# Altium footprint library Dart_Controller_Pcblib.PcbLib: 132 footprints (part 2 of 9)
Each footprint in its own frame and in the unit in brackets; x right, y up, seen from the top. Pads: shape width x height; smd on the part's side, far side on the other; paste and mask are expansions set on the pad; w line width, h text height; cw(c..) or ccw(c..) is an arc to the next point about the centre after c.
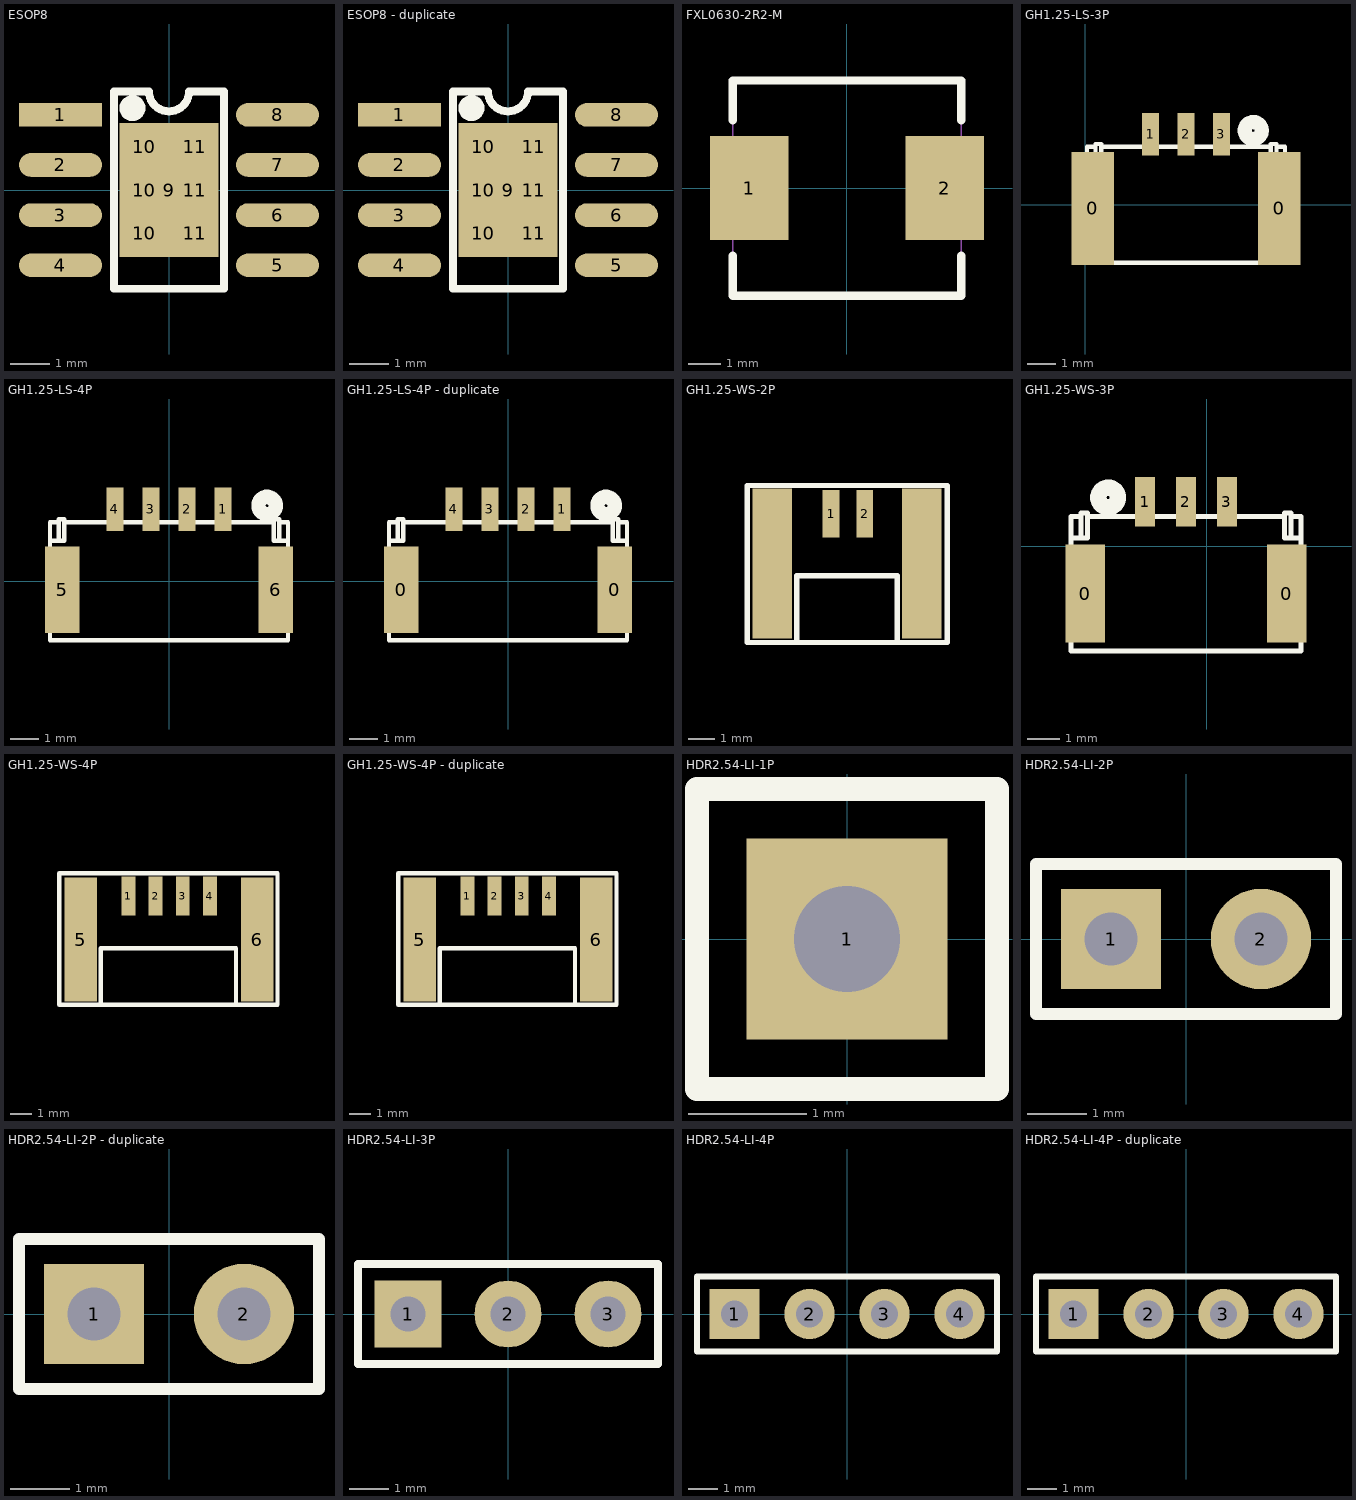
[diagram p1: the footprints below, top view; thin cyan lines are the x and y axes]

## ESOP8 [mm]
pads (15):
  rect 2.1x0.6 smd: 1(-2.75,1.905)
  oval 2.1x0.6 smd: 2(-2.75,0.635) 3(-2.75,-0.635) 4(-2.75,-1.905) 5(2.75,-1.905) 6(2.75,-0.635) 7(2.75,0.635) 8(2.75,1.905)
  rect 2.5x3.4 smd paste-2: 9(0,0)
  rect 0.9x0.7 on Top Paste: 10(-0.625,-1.1) 10(-0.625,0) 10(-0.625,1.1) 11(0.65,-1.1) 11(0.65,0) 11(0.65,1.1)
Top Overlay:
  circle w0.35: c-0.925,2.075 r0.155
  lines w0.2: -1.397,2.5 -1.397,-2.5 1.397,-2.5 1.397,2.5
  lines w0.203: -1.397,2.5 -0.508,2.5 ccw(c0,2.5) 0,1.992 ccw(c0,2.5) 0.508,2.5 1.397,2.5
Mechanical 15:
  circle w0.05: c0,0 r0.35
  lines w0.05: -0.5,0 0.5,0 ; 0,-0.5 0,0.5
3D body "ESOP8.STEP": height 1.53, standoff -0.01, extent -3.053,-2.5 2.953,2.5

## ESOP8 - duplicate [mm]
pads (15):
  rect 2.1x0.6 smd: 1(-2.75,1.905)
  oval 2.1x0.6 smd: 2(-2.75,0.635) 3(-2.75,-0.635) 4(-2.75,-1.905) 5(2.75,-1.905) 6(2.75,-0.635) 7(2.75,0.635) 8(2.75,1.905)
  rect 2.5x3.4 smd paste-2: 9(0,0)
  rect 0.9x0.7 on Top Paste: 10(-0.625,-1.1) 10(-0.625,0) 10(-0.625,1.1) 11(0.65,-1.1) 11(0.65,0) 11(0.65,1.1)
Top Overlay:
  circle w0.35: c-0.925,2.075 r0.155
  lines w0.2: -1.397,2.5 -1.397,-2.5 1.397,-2.5 1.397,2.5
  lines w0.203: -1.397,2.5 -0.508,2.5 ccw(c0,2.5) 0,1.992 ccw(c0,2.5) 0.508,2.5 1.397,2.5
Mechanical 15:
  circle w0.05: c0,0 r0.35
  lines w0.05: -0.5,0 0.5,0 ; 0,-0.5 0,0.5
3D body "ESOP8.STEP": height 1.53, standoff -0.01, extent -3.053,-2.5 2.953,2.5

## FXL0630-2R2-M [mm] "功率电感 2.2uh"
pads (2):
  rect 2.4x3.2 smd: 1(-3,0) 2(3,0)
Top Overlay:
  lines w0.254: -3.5,-2.081 -3.5,-3.3 -3.49,-3.3 3.5,-3.3 3.5,-2.081 ; -3.5,2.081 -3.5,3.3 3.48,3.3 3.5,3.28 ; 3.5,2.081 3.5,3.3
Mechanical 15:
  region: -3.44,-3.3 -3.44,-3.275 -3.475,-3.24 -3.525,-3.24 -3.56,-3.275 -3.56,-3.3 -3.56,-3.325 -3.525,-3.36 -3.475,-3.36 -3.44,-3.325
  region: 1.9,1.5 3.5,1.5 3.5,-1.5 1.9,-1.5
  region: -1.9,-1.5 -3.5,-1.5 -3.5,1.5 -1.9,1.5
  lines w0.051: -3.5,-3.3 -3.5,3.3 3.5,3.3 3.5,-3.3 -3.5,-3.3
3D body "2.uh-PCBModelSOLID.step": height 3.1, standoff 0, extent -3.691,-3.173 3.31,3.427

## GH1.25-LS-3P [mm] "A1257WR-S-3P"
height 1.5
pads (5):
  rect 1.5x4 smd: 0(0.254,-0.127) 0(6.858,-0.127)
  rect 0.6x1.5 smd: 1(2.306,2.5) 2(3.556,2.5) 3(4.806,2.5)
Top Overlay:
  circle w0.5: c5.932,2.627 r0.3
  lines w0.102: 2.206,2.15 2.206,2.85 2.406,2.85 2.406,2.15 ; 3.456,2.15 3.456,2.85 3.656,2.85 3.656,2.15 ; 4.706,2.15 4.706,2.85 4.906,2.85 4.906,2.15
  lines w0.152: 0.356,1.4 0.356,2.15 0.556,2.15 0.556,2.05 ; 0.356,2.05 0.056,2.05 0.056,1.4 ; 2.206,2.05 2.206,2.15 2.406,2.15 2.406,2.05 ; 3.456,2.05 3.456,2.15 3.656,2.15 3.656,2.05 ; 4.706,2.05 4.706,2.15 4.906,2.15 4.906,2.05 ; 6.756,1.4 6.756,2.15 6.556,2.15 6.556,2.05 ; 6.756,2.05 7.056,2.05 7.056,1.4 ; 0.056,1.4 0.556,1.4 0.556,2.05 ; 0.056,1.4 0.056,-2.05 7.056,-2.05 7.056,1.4 ; 0.556,2.05 6.556,2.05 ; 6.556,2.05 6.556,1.4 7.056,1.4
3D body "A1257WR-S-3P.stp": height 4.2, standoff -0.7, extent 0.691,-2.15 7.691,2.25

## GH1.25-LS-4P [mm] "A1257WR-S-4P"
height 1.5
pads (6):
  rect 0.6x1.5 smd: 1(1.875,2.5) 2(0.625,2.5) 3(-0.625,2.5) 4(-1.875,2.5)
  rect 1.2x3 smd: 5(-3.7,-0.3) 6(3.7,-0.3)
Top Overlay:
  circle w0.5: c3.401,2.627 r0.3
  lines w0.102: -1.975,2.15 -1.975,2.85 -1.775,2.85 -1.775,2.15 ; -0.725,2.15 -0.725,2.85 -0.525,2.85 -0.525,2.15 ; 0.525,2.15 0.525,2.85 0.725,2.85 0.725,2.15 ; 1.775,2.15 1.775,2.85 1.975,2.85 1.975,2.15
  lines w0.152: -3.825,1.4 -3.825,2.15 -3.625,2.15 -3.625,2.05 ; -3.825,2.05 -4.125,2.05 -4.125,1.4 ; -1.975,2.05 -1.975,2.15 -1.775,2.15 -1.775,2.05 ; -0.725,2.05 -0.725,2.15 -0.525,2.15 -0.525,2.05 ; 0.525,2.05 0.525,2.15 0.725,2.15 0.725,2.05 ; 1.775,2.05 1.775,2.15 1.975,2.15 1.975,2.05 ; 3.825,1.4 3.825,2.15 3.625,2.15 3.625,2.05 ; 3.825,2.05 4.125,2.05 4.125,1.4 ; -4.125,1.4 -4.125,-2.05 4.125,-2.05 4.125,1.4 ; -4.125,1.4 -3.625,1.4 -3.625,2.05 ; -3.625,2.05 3.625,2.05 ; 3.625,2.05 3.625,1.4 4.125,1.4
3D body "A1257WR-S-4P.stp": height 4.2, standoff -0.7, extent -4.125,-2.15 4.125,2.25

## GH1.25-LS-4P - duplicate [mm] "A1257WR-S-4P"
height 1.5
pads (6):
  rect 1.2x3 smd: 0(-3.7,-0.3) 0(3.7,-0.3)
  rect 0.6x1.5 smd: 1(1.875,2.5) 2(0.625,2.5) 3(-0.625,2.5) 4(-1.875,2.5)
Top Overlay:
  circle w0.5: c3.401,2.627 r0.3
  lines w0.102: -1.975,2.15 -1.975,2.85 -1.775,2.85 -1.775,2.15 ; -0.725,2.15 -0.725,2.85 -0.525,2.85 -0.525,2.15 ; 0.525,2.15 0.525,2.85 0.725,2.85 0.725,2.15 ; 1.775,2.15 1.775,2.85 1.975,2.85 1.975,2.15
  lines w0.152: -3.825,1.4 -3.825,2.15 -3.625,2.15 -3.625,2.05 ; -3.825,2.05 -4.125,2.05 -4.125,1.4 ; -1.975,2.05 -1.975,2.15 -1.775,2.15 -1.775,2.05 ; -0.725,2.05 -0.725,2.15 -0.525,2.15 -0.525,2.05 ; 0.525,2.05 0.525,2.15 0.725,2.15 0.725,2.05 ; 1.775,2.05 1.775,2.15 1.975,2.15 1.975,2.05 ; 3.825,1.4 3.825,2.15 3.625,2.15 3.625,2.05 ; 3.825,2.05 4.125,2.05 4.125,1.4 ; -4.125,1.4 -4.125,-2.05 4.125,-2.05 4.125,1.4 ; -4.125,1.4 -3.625,1.4 -3.625,2.05 ; -3.625,2.05 3.625,2.05 ; 3.625,2.05 3.625,1.4 4.125,1.4
3D body "A1257WR-S-4P.stp": height 4.2, standoff -0.7, extent -4.125,-2.15 4.125,2.25

## GH1.25-WS-2P [mm] "卧贴"
pads (4):
  rect 0.635x1.8 smd: 1(9.3,63.062) 2(10.575,63.062)
  rect 1.5x5.7 smd: ""(7.061,61.163) ""(12.751,61.163)
Top Overlay:
  lines w0.2: 8.001,58.166 8.001,60.706 11.811,60.706 11.811,58.166 ; 6.121,58.166 6.121,64.135 13.716,64.135 13.716,58.166 6.121,58.166
3D body "SM02B-GHS-TB.STEP": height 4.25, standoff -0.1, extent 7.044,58.318 12.794,63.168

## GH1.25-WS-3P [mm] "A1257WR-S-3P"
height 1.5
pads (5):
  rect 1.2x3 smd: 0(-3.71,-1.443) 0(2.44,-1.443)
  rect 0.6x1.5 smd: 1(-1.885,1.357) 2(-0.635,1.357) 3(0.615,1.357)
Top Overlay:
  circle w0.5: c-3.011,1.484 r0.3
  lines w0.102: -1.985,1.007 -1.985,1.707 -1.785,1.707 -1.785,1.007 ; -0.735,1.007 -0.735,1.707 -0.535,1.707 -0.535,1.007 ; 0.515,1.007 0.515,1.707 0.715,1.707 0.715,1.007
  lines w0.152: -3.835,0.257 -3.835,1.007 -3.635,1.007 -3.635,0.907 ; -3.835,0.907 -4.135,0.907 -4.135,0.257 ; -1.985,0.907 -1.985,1.007 -1.785,1.007 -1.785,0.907 ; -0.735,0.907 -0.735,1.007 -0.535,1.007 -0.535,0.907 ; 0.515,0.907 0.515,1.007 0.715,1.007 0.715,0.907 ; 2.565,0.257 2.565,1.007 2.365,1.007 2.365,0.907 ; 2.565,0.907 2.865,0.907 2.865,0.257 ; -4.135,0.257 -4.135,-3.193 2.865,-3.193 2.865,0.257 ; -4.135,0.257 -3.635,0.257 -3.635,0.907 ; -3.635,0.907 2.365,0.907 ; 2.365,0.907 2.365,0.257 2.865,0.257
3D body "A1257WR-S-3P.stp": height 4.4, standoff 0, extent -4.262,-3.084 2.738,1.816

## GH1.25-WS-4P [mm] "卧贴"
pads (6):
  rect 0.635x1.8 smd: 1(11.176,12.799) 2(12.426,12.799) 3(13.676,12.799) 4(14.926,12.799)
  rect 1.5x5.7 smd: 5(8.992,10.795) 6(17.094,10.795)
Top Overlay:
  lines w0.2: 9.906,7.8 9.906,10.4 16.129,10.4 16.129,7.8 ; 8.001,7.8 18.034,7.8 18.034,13.843 8.001,13.843 8.001,7.8
3D body "User Library-SM04B-GHS-TB.sldprt": height 4.25, standoff -0.1, extent 8.956,7.977 17.206,12.827

## GH1.25-WS-4P - duplicate [mm] "卧贴"
pads (6):
  rect 0.635x1.8 smd: 1(11.176,12.799) 2(12.426,12.799) 3(13.676,12.799) 4(14.926,12.799)
  rect 1.5x5.7 smd: 5(8.992,10.795) 6(17.094,10.795)
Top Overlay:
  lines w0.2: 9.906,7.8 9.906,10.4 16.129,10.4 16.129,7.8 ; 8.001,7.8 8.001,13.843 18.034,13.843 18.034,7.8 8.001,7.8
3D body "User Library-SM04B-GHS-TB.sldprt": height 4.25, standoff -0.1, extent 8.956,7.977 17.206,12.827

## HDR2.54-LI-1P [mm] "封装库来自淘宝卖家 ID：黄晶宝石"
pads (1):
  rect 1.7x1.7 hole 0.9: 1(0,0)
Top Overlay:
  lines w0.2: -1.27,-1.27 1.27,-1.27 1.27,1.27 -1.27,1.27 -1.27,-1.27
3D body "HDR2.54-1P.STEP": height 8.5, standoff -3, extent -1.27,-1.27 1.27,1.27

## HDR2.54-LI-2P [mm] "封装库来自淘宝卖家 ID：黄晶宝石"
pads (2):
  rect 1.7x1.7 hole 0.9: 1(-1.27,0)
  round 1.7 hole 0.9: 2(1.27,0)
Top Overlay:
  lines w0.2: -2.54,-1.27 2.54,-1.27 2.54,1.27 -2.54,1.27 -2.54,-1.27
3D body "HDR2.54-1P.STEP": height 8.5, standoff -3, extent -2.54,-1.27 0,1.27
3D body "HDR2.54-1P.STEP": height 8.5, standoff -3, extent 0,-1.27 2.54,1.27

## HDR2.54-LI-2P - duplicate [mm] "封装库来自淘宝卖家 ID：黄晶宝石"
pads (2):
  rect 1.7x1.7 hole 0.9: 1(-1.27,0)
  round 1.7 hole 0.9: 2(1.27,0)
Top Overlay:
  lines w0.2: -2.54,-1.27 2.54,-1.27 2.54,1.27 -2.54,1.27 -2.54,-1.27
3D body "HDR2.54-1P.STEP": height 8.5, standoff -3, extent -2.54,-1.27 0,1.27
3D body "HDR2.54-1P.STEP": height 8.5, standoff -3, extent 0,-1.27 2.54,1.27

## HDR2.54-LI-3P [mm] "排针，3脚"
pads (3):
  rect 1.7x1.7 hole 0.9: 1(-2.54,0)
  round 1.7 hole 0.9: 2(0,0) 3(2.54,0)
Top Overlay:
  lines w0.2: -3.81,-1.27 -3.81,1.27 3.81,1.27 3.81,-1.27 -3.81,-1.27
3D body "HDR2.54-1P.STEP": height 8.5, standoff -3, extent 1.27,-1.27 3.81,1.27
3D body "HDR2.54-1P.STEP": height 8.5, standoff -3, extent -1.27,-1.27 1.27,1.27
3D body "HDR2.54-1P.STEP": height 8.5, standoff -3, extent -3.81,-1.27 -1.27,1.27

## HDR2.54-LI-4P [mm] "排针，4脚"
pads (4):
  rect 1.7x1.7 hole 0.9: 1(-3.81,0)
  round 1.7 hole 0.9: 2(-1.27,0) 3(1.27,0) 4(3.81,0)
Top Overlay:
  lines w0.2: -5.08,-1.27 5.08,-1.27 5.08,1.27 -5.08,1.27 -5.08,-1.27
3D body "HDR2.54-1P.STEP": height 8.5, standoff -3, extent 2.54,-1.27 5.08,1.27
3D body "HDR2.54-1P.STEP": height 8.5, standoff -3, extent 0,-1.27 2.54,1.27
3D body "HDR2.54-1P.STEP": height 8.5, standoff -3, extent -2.54,-1.27 0,1.27
3D body "HDR2.54-1P.STEP": height 8.5, standoff -3, extent -5.08,-1.27 -2.54,1.27

## HDR2.54-LI-4P - duplicate [mm] "排针，4脚"
pads (4):
  rect 1.7x1.7 hole 0.9: 1(-3.81,0)
  round 1.7 hole 0.9: 2(-1.27,0) 3(1.27,0) 4(3.81,0)
Top Overlay:
  lines w0.2: -5.08,-1.27 5.08,-1.27 5.08,1.27 -5.08,1.27 -5.08,-1.27
3D body "HDR2.54-1P.STEP": height 8.5, standoff -3, extent 2.54,-1.27 5.08,1.27
3D body "HDR2.54-1P.STEP": height 8.5, standoff -3, extent 0,-1.27 2.54,1.27
3D body "HDR2.54-1P.STEP": height 8.5, standoff -3, extent -2.54,-1.27 0,1.27
3D body "HDR2.54-1P.STEP": height 8.5, standoff -3, extent -5.08,-1.27 -2.54,1.27